# Altium footprint library ST封装.PcbLib: 1336 footprints (part 34 of 109)
Each footprint in its own frame and in the unit in brackets; x right, y up, seen from the top. Pads: shape width x height; smd on the part's side, far side on the other; paste and mask are expansions set on the pad; w line width, h text height; cw(c..) or ccw(c..) is an arc to the next point about the centre after c.
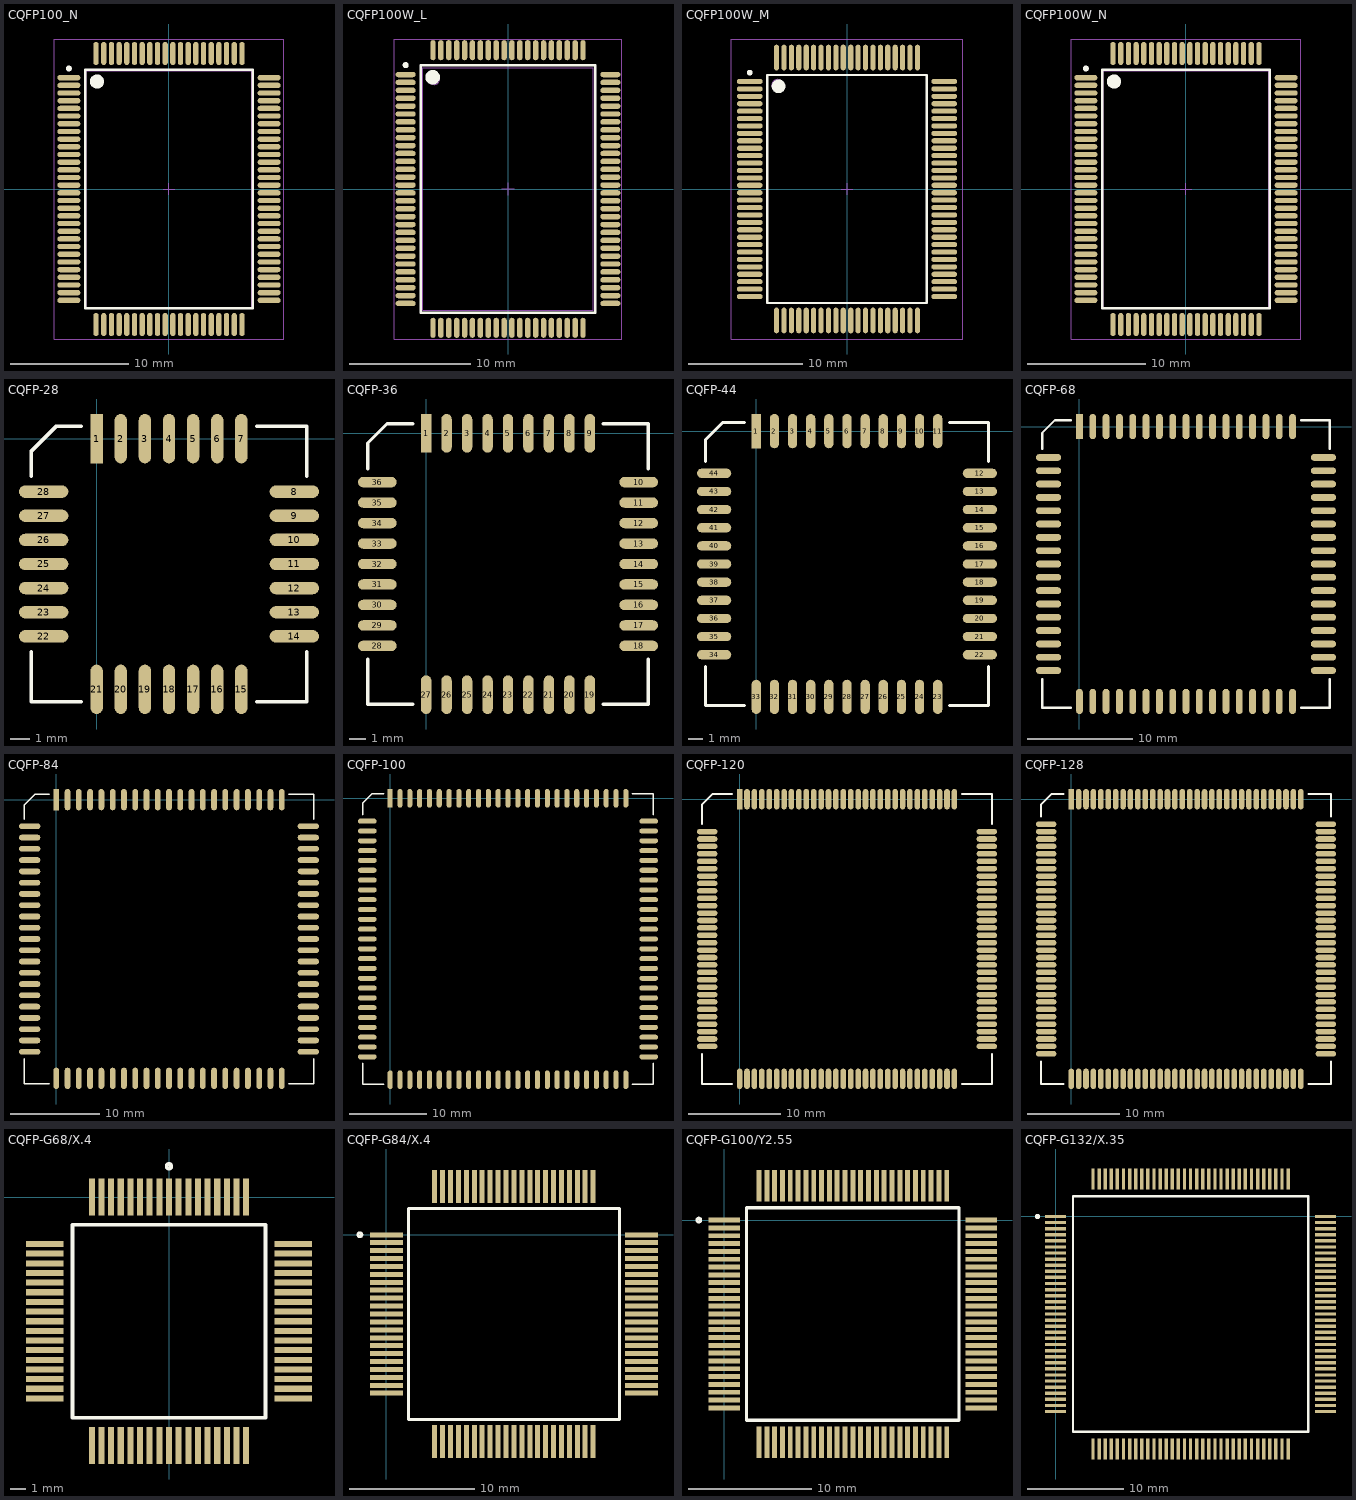
[diagram p33: the footprints below, top view; thin cyan lines are the x and y axes]

## CQFP100_N [mm] "100-Pin Ceramic Quad Flat Pack Rectangular 0.65 mm Pitch, IPC Medium Density"
height 3.4
pads (100):
  oval 1.95x0.45 smd: 1(-8.475,9.425) 2(-8.475,8.775) 3(-8.475,8.125) 4(-8.475,7.475) 5(-8.475,6.825) 6(-8.475,6.175) 7(-8.475,5.525) 8(-8.475,4.875) 9(-8.475,4.225) 10(-8.475,3.575) 11(-8.475,2.925) 12(-8.475,2.275) 13(-8.475,1.625) 14(-8.475,0.975) 15(-8.475,0.325) 16(-8.475,-0.325) 17(-8.475,-0.975) 18(-8.475,-1.625) 19(-8.475,-2.275) 20(-8.475,-2.925) 21(-8.475,-3.575) 22(-8.475,-4.225) 23(-8.475,-4.875) 24(-8.475,-5.525) 25(-8.475,-6.175) 26(-8.475,-6.825) 27(-8.475,-7.475) 28(-8.475,-8.125) 29(-8.475,-8.775) 30(-8.475,-9.425) 51(8.475,-9.425) 52(8.475,-8.775) 53(8.475,-8.125) 54(8.475,-7.475) 55(8.475,-6.825) 56(8.475,-6.175) 57(8.475,-5.525) 58(8.475,-4.875) 59(8.475,-4.225) 60(8.475,-3.575) 61(8.475,-2.925) 62(8.475,-2.275) 63(8.475,-1.625) 64(8.475,-0.975) 65(8.475,-0.325) 66(8.475,0.325) 67(8.475,0.975) 68(8.475,1.625) 69(8.475,2.275) 70(8.475,2.925) 71(8.475,3.575) 72(8.475,4.225) 73(8.475,4.875) 74(8.475,5.525) 75(8.475,6.175) 76(8.475,6.825) 77(8.475,7.475) 78(8.475,8.125) 79(8.475,8.775) 80(8.475,9.425)
  oval 0.45x1.95 smd: 31(-6.175,-11.475) 32(-5.525,-11.475) 33(-4.875,-11.475) 34(-4.225,-11.475) 35(-3.575,-11.475) 36(-2.925,-11.475) 37(-2.275,-11.475) 38(-1.625,-11.475) 39(-0.975,-11.475) 40(-0.325,-11.475) 41(0.325,-11.475) 42(0.975,-11.475) 43(1.625,-11.475) 44(2.275,-11.475) 45(2.925,-11.475) 46(3.575,-11.475) 47(4.225,-11.475) 48(4.875,-11.475) 49(5.525,-11.475) 50(6.175,-11.475) 81(6.175,11.475) 82(5.525,11.475) 83(4.875,11.475) 84(4.225,11.475) 85(3.575,11.475) 86(2.925,11.475) 87(2.275,11.475) 88(1.625,11.475) 89(0.975,11.475) 90(0.325,11.475) 91(-0.325,11.475) 92(-0.975,11.475) 93(-1.625,11.475) 94(-2.275,11.475) 95(-2.925,11.475) 96(-3.575,11.475) 97(-4.225,11.475) 98(-4.875,11.475) 99(-5.525,11.475) 100(-6.175,11.475)
Top Overlay:
  circle w0.25: c-8.475,10.2 r0.125
  circle w0.6: c-6.1,9.1 r0.3
  lines w0.2: -7.1,-10.1 -7.1,10.1 7.1,10.1 7.1,-10.1 -7.1,-10.1
Mechanical 13:
  circle w0.1: c-6.1,9.1 r0.5
  lines w0.1: -7,-10 -7,10 7,10 7,-10 -7,-10
Mechanical 15:
  lines w0.1: -0.5,0 0.5,0 ; 0,-0.5 0,0.5 ; -9.7,-12.7 -9.7,12.7 9.7,12.7 9.7,-12.7 -9.7,-12.7
3D body: height 3.4, standoff 0, extent -7,-10 7,10

## CQFP100W_L [mm] "100-Pin Ceramic Quad Flat Pack Rectangular 0.65 mm Pitch, IPC High Density"
height 3.24
pads (100):
  oval 1.65x0.45 smd: 1(-8.425,9.425) 2(-8.425,8.775) 3(-8.425,8.125) 4(-8.425,7.475) 5(-8.425,6.825) 6(-8.425,6.175) 7(-8.425,5.525) 8(-8.425,4.875) 9(-8.425,4.225) 10(-8.425,3.575) 11(-8.425,2.925) 12(-8.425,2.275) 13(-8.425,1.625) 14(-8.425,0.975) 15(-8.425,0.325) 16(-8.425,-0.325) 17(-8.425,-0.975) 18(-8.425,-1.625) 19(-8.425,-2.275) 20(-8.425,-2.925) 21(-8.425,-3.575) 22(-8.425,-4.225) 23(-8.425,-4.875) 24(-8.425,-5.525) 25(-8.425,-6.175) 26(-8.425,-6.825) 27(-8.425,-7.475) 28(-8.425,-8.125) 29(-8.425,-8.775) 30(-8.425,-9.425) 51(8.425,-9.425) 52(8.425,-8.775) 53(8.425,-8.125) 54(8.425,-7.475) 55(8.425,-6.825) 56(8.425,-6.175) 57(8.425,-5.525) 58(8.425,-4.875) 59(8.425,-4.225) 60(8.425,-3.575) 61(8.425,-2.925) 62(8.425,-2.275) 63(8.425,-1.625) 64(8.425,-0.975) 65(8.425,-0.325) 66(8.425,0.325) 67(8.425,0.975) 68(8.425,1.625) 69(8.425,2.275) 70(8.425,2.925) 71(8.425,3.575) 72(8.425,4.225) 73(8.425,4.875) 74(8.425,5.525) 75(8.425,6.175) 76(8.425,6.825) 77(8.425,7.475) 78(8.425,8.125) 79(8.425,8.775) 80(8.425,9.425)
  oval 0.45x1.65 smd: 31(-6.175,-11.425) 32(-5.525,-11.425) 33(-4.875,-11.425) 34(-4.225,-11.425) 35(-3.575,-11.425) 36(-2.925,-11.425) 37(-2.275,-11.425) 38(-1.625,-11.425) 39(-0.975,-11.425) 40(-0.325,-11.425) 41(0.325,-11.425) 42(0.975,-11.425) 43(1.625,-11.425) 44(2.275,-11.425) 45(2.925,-11.425) 46(3.575,-11.425) 47(4.225,-11.425) 48(4.875,-11.425) 49(5.525,-11.425) 50(6.175,-11.425) 81(6.175,11.425) 82(5.525,11.425) 83(4.875,11.425) 84(4.225,11.425) 85(3.575,11.425) 86(2.925,11.425) 87(2.275,11.425) 88(1.625,11.425) 89(0.975,11.425) 90(0.325,11.425) 91(-0.325,11.425) 92(-0.975,11.425) 93(-1.625,11.425) 94(-2.275,11.425) 95(-2.925,11.425) 96(-3.575,11.425) 97(-4.225,11.425) 98(-4.875,11.425) 99(-5.525,11.425) 100(-6.175,11.425)
Top Overlay:
  circle w0.6: c-6.2,9.2 r0.3
  circle w0.25: c-8.425,10.2 r0.125
  lines w0.2: -7.2,-10.2 7.2,-10.2 7.2,10.2 -7.2,10.2 -7.2,-10.2
Mechanical 13:
  circle w0.1: c-6.1,9.1 r0.5
  lines w0.1: -7,-10 7,-10 7,10 -7,10 -7,-10
Mechanical 15:
  lines w0.1: -0.5,0 0.5,0 ; 0,-0.5 0,0.5 ; -9.35,-12.35 9.35,-12.35 9.35,12.35 -9.35,12.35 -9.35,-12.35
3D body: height 3.24, standoff 0, extent -7,-10 7,10

## CQFP100W_M [mm] "100-Pin Ceramic Quad Flat Pack Rectangular 0.65 mm Pitch, IPC Low Density"
height 3.24
pads (100):
  oval 2.25x0.45 smd: 1(-8.525,9.425) 2(-8.525,8.775) 3(-8.525,8.125) 4(-8.525,7.475) 5(-8.525,6.825) 6(-8.525,6.175) 7(-8.525,5.525) 8(-8.525,4.875) 9(-8.525,4.225) 10(-8.525,3.575) 11(-8.525,2.925) 12(-8.525,2.275) 13(-8.525,1.625) 14(-8.525,0.975) 15(-8.525,0.325) 16(-8.525,-0.325) 17(-8.525,-0.975) 18(-8.525,-1.625) 19(-8.525,-2.275) 20(-8.525,-2.925) 21(-8.525,-3.575) 22(-8.525,-4.225) 23(-8.525,-4.875) 24(-8.525,-5.525) 25(-8.525,-6.175) 26(-8.525,-6.825) 27(-8.525,-7.475) 28(-8.525,-8.125) 29(-8.525,-8.775) 30(-8.525,-9.425) 51(8.525,-9.425) 52(8.525,-8.775) 53(8.525,-8.125) 54(8.525,-7.475) 55(8.525,-6.825) 56(8.525,-6.175) 57(8.525,-5.525) 58(8.525,-4.875) 59(8.525,-4.225) 60(8.525,-3.575) 61(8.525,-2.925) 62(8.525,-2.275) 63(8.525,-1.625) 64(8.525,-0.975) 65(8.525,-0.325) 66(8.525,0.325) 67(8.525,0.975) 68(8.525,1.625) 69(8.525,2.275) 70(8.525,2.925) 71(8.525,3.575) 72(8.525,4.225) 73(8.525,4.875) 74(8.525,5.525) 75(8.525,6.175) 76(8.525,6.825) 77(8.525,7.475) 78(8.525,8.125) 79(8.525,8.775) 80(8.525,9.425)
  oval 0.45x2.25 smd: 31(-6.175,-11.525) 32(-5.525,-11.525) 33(-4.875,-11.525) 34(-4.225,-11.525) 35(-3.575,-11.525) 36(-2.925,-11.525) 37(-2.275,-11.525) 38(-1.625,-11.525) 39(-0.975,-11.525) 40(-0.325,-11.525) 41(0.325,-11.525) 42(0.975,-11.525) 43(1.625,-11.525) 44(2.275,-11.525) 45(2.925,-11.525) 46(3.575,-11.525) 47(4.225,-11.525) 48(4.875,-11.525) 49(5.525,-11.525) 50(6.175,-11.525) 81(6.175,11.525) 82(5.525,11.525) 83(4.875,11.525) 84(4.225,11.525) 85(3.575,11.525) 86(2.925,11.525) 87(2.275,11.525) 88(1.625,11.525) 89(0.975,11.525) 90(0.325,11.525) 91(-0.325,11.525) 92(-0.975,11.525) 93(-1.625,11.525) 94(-2.275,11.525) 95(-2.925,11.525) 96(-3.575,11.525) 97(-4.225,11.525) 98(-4.875,11.525) 99(-5.525,11.525) 100(-6.175,11.525)
Top Overlay:
  circle w0.25: c-8.525,10.2 r0.125
  circle w0.6: c-6,9 r0.3
  lines w0.2: -7,-10 -7,10 7,10 7,-10 -7,-10
Mechanical 13:
  circle w0.1: c-6.1,9.1 r0.5
  lines w0.1: -7,-10 -7,10 7,10 7,-10 -7,-10
Mechanical 15:
  lines w0.1: -0.5,0 0.5,0 ; 0,-0.5 0,0.5 ; -10.15,-13.15 -10.15,13.15 10.15,13.15 10.15,-13.15 -10.15,-13.15
3D body: height 3.24, standoff 0, extent -7,-10 7,10

## CQFP100W_N [mm] "100-Pin Ceramic Quad Flat Pack Rectangular 0.65 mm Pitch, IPC Medium Density"
height 3.24
pads (100):
  oval 1.95x0.45 smd: 1(-8.475,9.425) 2(-8.475,8.775) 3(-8.475,8.125) 4(-8.475,7.475) 5(-8.475,6.825) 6(-8.475,6.175) 7(-8.475,5.525) 8(-8.475,4.875) 9(-8.475,4.225) 10(-8.475,3.575) 11(-8.475,2.925) 12(-8.475,2.275) 13(-8.475,1.625) 14(-8.475,0.975) 15(-8.475,0.325) 16(-8.475,-0.325) 17(-8.475,-0.975) 18(-8.475,-1.625) 19(-8.475,-2.275) 20(-8.475,-2.925) 21(-8.475,-3.575) 22(-8.475,-4.225) 23(-8.475,-4.875) 24(-8.475,-5.525) 25(-8.475,-6.175) 26(-8.475,-6.825) 27(-8.475,-7.475) 28(-8.475,-8.125) 29(-8.475,-8.775) 30(-8.475,-9.425) 51(8.475,-9.425) 52(8.475,-8.775) 53(8.475,-8.125) 54(8.475,-7.475) 55(8.475,-6.825) 56(8.475,-6.175) 57(8.475,-5.525) 58(8.475,-4.875) 59(8.475,-4.225) 60(8.475,-3.575) 61(8.475,-2.925) 62(8.475,-2.275) 63(8.475,-1.625) 64(8.475,-0.975) 65(8.475,-0.325) 66(8.475,0.325) 67(8.475,0.975) 68(8.475,1.625) 69(8.475,2.275) 70(8.475,2.925) 71(8.475,3.575) 72(8.475,4.225) 73(8.475,4.875) 74(8.475,5.525) 75(8.475,6.175) 76(8.475,6.825) 77(8.475,7.475) 78(8.475,8.125) 79(8.475,8.775) 80(8.475,9.425)
  oval 0.45x1.95 smd: 31(-6.175,-11.475) 32(-5.525,-11.475) 33(-4.875,-11.475) 34(-4.225,-11.475) 35(-3.575,-11.475) 36(-2.925,-11.475) 37(-2.275,-11.475) 38(-1.625,-11.475) 39(-0.975,-11.475) 40(-0.325,-11.475) 41(0.325,-11.475) 42(0.975,-11.475) 43(1.625,-11.475) 44(2.275,-11.475) 45(2.925,-11.475) 46(3.575,-11.475) 47(4.225,-11.475) 48(4.875,-11.475) 49(5.525,-11.475) 50(6.175,-11.475) 81(6.175,11.475) 82(5.525,11.475) 83(4.875,11.475) 84(4.225,11.475) 85(3.575,11.475) 86(2.925,11.475) 87(2.275,11.475) 88(1.625,11.475) 89(0.975,11.475) 90(0.325,11.475) 91(-0.325,11.475) 92(-0.975,11.475) 93(-1.625,11.475) 94(-2.275,11.475) 95(-2.925,11.475) 96(-3.575,11.475) 97(-4.225,11.475) 98(-4.875,11.475) 99(-5.525,11.475) 100(-6.175,11.475)
Top Overlay:
  circle w0.25: c-8.475,10.2 r0.125
  circle w0.6: c-6.1,9.1 r0.3
  lines w0.2: -7.1,-10.1 -7.1,10.1 7.1,10.1 7.1,-10.1 -7.1,-10.1
Mechanical 13:
  circle w0.1: c-6.1,9.1 r0.5
  lines w0.1: -7,-10 -7,10 7,10 7,-10 -7,-10
Mechanical 15:
  lines w0.1: -0.5,0 0.5,0 ; 0,-0.5 0,0.5 ; -9.7,-12.7 -9.7,12.7 9.7,12.7 9.7,-12.7 -9.7,-12.7
3D body: height 3.24, standoff 0, extent -7,-10 7,10

## CQFP-28 [mm]
pads (28):
  rect 0.65x2.6 smd: 1(0,0)
  oval 0.65x2.6 smd: 2(1.27,0) 3(2.54,0) 4(3.81,0) 5(5.08,0) 6(6.35,0) 7(7.62,0) 15(7.62,-13.2) 16(6.35,-13.2) 17(5.08,-13.2) 18(3.81,-13.2) 19(2.54,-13.2) 20(1.27,-13.2) 21(0,-13.2)
  oval 2.6x0.65 smd: 8(10.41,-2.79) 9(10.41,-4.06) 10(10.41,-5.33) 11(10.41,-6.6) 12(10.41,-7.87) 13(10.41,-9.14) 14(10.41,-10.41) 22(-2.79,-10.41) 23(-2.79,-9.14) 24(-2.79,-7.87) 25(-2.79,-6.6) 26(-2.79,-5.33) 27(-2.79,-4.06) 28(-2.79,-2.79)
Top Overlay:
  lines w0.2: -3.44,-11.235 -3.44,-13.85 -0.825,-13.85 ; -3.44,-1.965 -3.44,-0.65 -2.14,0.65 -0.825,0.65 ; 8.445,-13.85 11.06,-13.85 11.06,-11.235 ; 8.445,0.65 11.06,0.65 11.06,-1.965

## CQFP-36 [mm]
pads (36):
  rect 0.65x2.4 smd: 1(0,0)
  oval 0.65x2.4 smd: 2(1.27,0) 3(2.54,0) 4(3.81,0) 5(5.08,0) 6(6.35,0) 7(7.62,0) 8(8.89,0) 9(10.16,0) 19(10.16,-16.2) 20(8.89,-16.2) 21(7.62,-16.2) 22(6.35,-16.2) 23(5.08,-16.2) 24(3.81,-16.2) 25(2.54,-16.2) 26(1.27,-16.2) 27(0,-16.2)
  oval 2.4x0.65 smd: 10(13.18,-3.02) 11(13.18,-4.29) 12(13.18,-5.56) 13(13.18,-6.83) 14(13.18,-8.1) 15(13.18,-9.37) 16(13.18,-10.64) 17(13.18,-11.91) 18(13.18,-13.18) 28(-3.02,-13.18) 29(-3.02,-11.91) 30(-3.02,-10.64) 31(-3.02,-9.37) 32(-3.02,-8.1) 33(-3.02,-6.83) 34(-3.02,-5.56) 35(-3.02,-4.29) 36(-3.02,-3.02)
Top Overlay:
  lines w0.2: -3.62,-14.005 -3.62,-16.8 -0.825,-16.8 ; -3.62,-2.195 -3.62,-0.6 -2.42,0.6 -0.825,0.6 ; 10.985,-16.8 13.78,-16.8 13.78,-14.005 ; 10.985,0.6 13.78,0.6 13.78,-2.195

## CQFP-44 [mm]
pads (44):
  rect 0.65x2.4 smd: 1(0,0)
  oval 0.65x2.4 smd: 2(1.27,0) 3(2.54,0) 4(3.81,0) 5(5.08,0) 6(6.35,0) 7(7.62,0) 8(8.89,0) 9(10.16,0) 10(11.43,0) 11(12.7,0) 23(12.7,-18.6) 24(11.43,-18.6) 25(10.16,-18.6) 26(8.89,-18.6) 27(7.62,-18.6) 28(6.35,-18.6) 29(5.08,-18.6) 30(3.81,-18.6) 31(2.54,-18.6) 32(1.27,-18.6) 33(0,-18.6)
  oval 2.4x0.65 smd: 12(15.65,-2.95) 13(15.65,-4.22) 14(15.65,-5.49) 15(15.65,-6.76) 16(15.65,-8.03) 17(15.65,-9.3) 18(15.65,-10.57) 19(15.65,-11.84) 20(15.65,-13.11) 21(15.65,-14.38) 22(15.65,-15.65) 34(-2.95,-15.65) 35(-2.95,-14.38) 36(-2.95,-13.11) 37(-2.95,-11.84) 38(-2.95,-10.57) 39(-2.95,-9.3) 40(-2.95,-8.03) 41(-2.95,-6.76) 42(-2.95,-5.49) 43(-2.95,-4.22) 44(-2.95,-2.95)
Top Overlay:
  lines w0.2: -3.55,-16.475 -3.55,-19.2 -0.825,-19.2 ; -3.55,-2.125 -3.55,-0.6 -2.35,0.6 -0.825,0.6 ; 13.525,-19.2 16.25,-19.2 16.25,-16.475 ; 13.525,0.6 16.25,0.6 16.25,-2.125

## CQFP-68 [mm]
pads (68):
  rect 0.65x2.4 smd: 1(0,0)
  oval 0.65x2.4 smd: 2(1.27,0) 3(2.54,0) 4(3.81,0) 5(5.08,0) 6(6.35,0) 7(7.62,0) 8(8.89,0) 9(10.16,0) 10(11.43,0) 11(12.7,0) 12(13.97,0) 13(15.24,0) 14(16.51,0) 15(17.78,0) 16(19.05,0) 17(20.32,0) 35(20.32,-26.2) 36(19.05,-26.2) 37(17.78,-26.2) 38(16.51,-26.2) 39(15.24,-26.2) 40(13.97,-26.2) 41(12.7,-26.2) 42(11.43,-26.2) 43(10.16,-26.2) 44(8.89,-26.2) 45(7.62,-26.2) 46(6.35,-26.2) 47(5.08,-26.2) 48(3.81,-26.2) 49(2.54,-26.2) 50(1.27,-26.2) 51(0,-26.2)
  oval 2.4x0.65 smd: 18(23.26,-2.94) 19(23.26,-4.21) 20(23.26,-5.48) 21(23.26,-6.75) 22(23.26,-8.02) 23(23.26,-9.29) 24(23.26,-10.56) 25(23.26,-11.83) 26(23.26,-13.1) 27(23.26,-14.37) 28(23.26,-15.64) 29(23.26,-16.91) 30(23.26,-18.18) 31(23.26,-19.45) 32(23.26,-20.72) 33(23.26,-21.99) 34(23.26,-23.26) 52(-2.94,-23.26) 53(-2.94,-21.99) 54(-2.94,-20.72) 55(-2.94,-19.45) 56(-2.94,-18.18) 57(-2.94,-16.91) 58(-2.94,-15.64) 59(-2.94,-14.37) 60(-2.94,-13.1) 61(-2.94,-11.83) 62(-2.94,-10.56) 63(-2.94,-9.29) 64(-2.94,-8.02) 65(-2.94,-6.75) 66(-2.94,-5.48) 67(-2.94,-4.21) 68(-2.94,-2.94)
Top Overlay:
  lines w0.2: -3.54,-24.085 -3.54,-26.8 -0.825,-26.8 ; -3.54,-2.115 -3.54,-0.6 -2.34,0.6 -0.825,0.6 ; 21.145,-26.8 23.86,-26.8 23.86,-24.085 ; 21.145,0.6 23.86,0.6 23.86,-2.115

## CQFP-84 [mm]
pads (84):
  rect 0.65x2.4 smd: 1(0,0)
  oval 0.65x2.4 smd: 2(1.27,0) 3(2.54,0) 4(3.81,0) 5(5.08,0) 6(6.35,0) 7(7.62,0) 8(8.89,0) 9(10.16,0) 10(11.43,0) 11(12.7,0) 12(13.97,0) 13(15.24,0) 14(16.51,0) 15(17.78,0) 16(19.05,0) 17(20.32,0) 18(21.59,0) 19(22.86,0) 20(24.13,0) 21(25.4,0) 43(25.4,-31.4) 44(24.13,-31.4) 45(22.86,-31.4) 46(21.59,-31.4) 47(20.32,-31.4) 48(19.05,-31.4) 49(17.78,-31.4) 50(16.51,-31.4) 51(15.24,-31.4) 52(13.97,-31.4) 53(12.7,-31.4) 54(11.43,-31.4) 55(10.16,-31.4) 56(8.89,-31.4) 57(7.62,-31.4) 58(6.35,-31.4) 59(5.08,-31.4) 60(3.81,-31.4) 61(2.54,-31.4) 62(1.27,-31.4) 63(0,-31.4)
  oval 2.4x0.65 smd: 22(28.4,-3) 23(28.4,-4.27) 24(28.4,-5.54) 25(28.4,-6.81) 26(28.4,-8.08) 27(28.4,-9.35) 28(28.4,-10.62) 29(28.4,-11.89) 30(28.4,-13.16) 31(28.4,-14.43) 32(28.4,-15.7) 33(28.4,-16.97) 34(28.4,-18.24) 35(28.4,-19.51) 36(28.4,-20.78) 37(28.4,-22.05) 38(28.4,-23.32) 39(28.4,-24.59) 40(28.4,-25.86) 41(28.4,-27.13) 42(28.4,-28.4) 64(-3,-28.4) 65(-3,-27.13) 66(-3,-25.86) 67(-3,-24.59) 68(-3,-23.32) 69(-3,-22.05) 70(-3,-20.78) 71(-3,-19.51) 72(-3,-18.24) 73(-3,-16.97) 74(-3,-15.7) 75(-3,-14.43) 76(-3,-13.16) 77(-3,-11.89) 78(-3,-10.62) 79(-3,-9.35) 80(-3,-8.08) 81(-3,-6.81) 82(-3,-5.54) 83(-3,-4.27) 84(-3,-3)
Top Overlay:
  lines w0.2: -3.6,-29.225 -3.6,-32 -0.825,-32 ; -3.6,-2.175 -3.6,-0.6 -2.4,0.6 -0.825,0.6 ; 26.225,-32 29,-32 29,-29.225 ; 26.225,0.6 29,0.6 29,-2.175

## CQFP-100 [mm]
pads (100):
  rect 0.65x2.4 smd: 1(0,0)
  oval 0.65x2.4 smd: 2(1.27,0) 3(2.54,0) 4(3.81,0) 5(5.08,0) 6(6.35,0) 7(7.62,0) 8(8.89,0) 9(10.16,0) 10(11.43,0) 11(12.7,0) 12(13.97,0) 13(15.24,0) 14(16.51,0) 15(17.78,0) 16(19.05,0) 17(20.32,0) 18(21.59,0) 19(22.86,0) 20(24.13,0) 21(25.4,0) 22(26.67,0) 23(27.94,0) 24(29.21,0) 25(30.48,0) 51(30.48,-36.4) 52(29.21,-36.4) 53(27.94,-36.4) 54(26.67,-36.4) 55(25.4,-36.4) 56(24.13,-36.4) 57(22.86,-36.4) 58(21.59,-36.4) 59(20.32,-36.4) 60(19.05,-36.4) 61(17.78,-36.4) 62(16.51,-36.4) 63(15.24,-36.4) 64(13.97,-36.4) 65(12.7,-36.4) 66(11.43,-36.4) 67(10.16,-36.4) 68(8.89,-36.4) 69(7.62,-36.4) 70(6.35,-36.4) 71(5.08,-36.4) 72(3.81,-36.4) 73(2.54,-36.4) 74(1.27,-36.4) 75(0,-36.4)
  oval 2.4x0.65 smd: 26(33.44,-2.96) 27(33.44,-4.23) 28(33.44,-5.5) 29(33.44,-6.77) 30(33.44,-8.04) 31(33.44,-9.31) 32(33.44,-10.58) 33(33.44,-11.85) 34(33.44,-13.12) 35(33.44,-14.39) 36(33.44,-15.66) 37(33.44,-16.93) 38(33.44,-18.2) 39(33.44,-19.47) 40(33.44,-20.74) 41(33.44,-22.01) 42(33.44,-23.28) 43(33.44,-24.55) 44(33.44,-25.82) 45(33.44,-27.09) 46(33.44,-28.36) 47(33.44,-29.63) 48(33.44,-30.9) 49(33.44,-32.17) 50(33.44,-33.44) 76(-2.96,-33.44) 77(-2.96,-32.17) 78(-2.96,-30.9) 79(-2.96,-29.63) 80(-2.96,-28.36) 81(-2.96,-27.09) 82(-2.96,-25.82) 83(-2.96,-24.55) 84(-2.96,-23.28) 85(-2.96,-22.01) 86(-2.96,-20.74) 87(-2.96,-19.47) 88(-2.96,-18.2) 89(-2.96,-16.93) 90(-2.96,-15.66) 91(-2.96,-14.39) 92(-2.96,-13.12) 93(-2.96,-11.85) 94(-2.96,-10.58) 95(-2.96,-9.31) 96(-2.96,-8.04) 97(-2.96,-6.77) 98(-2.96,-5.5) 99(-2.96,-4.23) 100(-2.96,-2.96)
Top Overlay:
  lines w0.2: -3.56,-34.265 -3.56,-37 -0.825,-37 ; -3.56,-2.135 -3.56,-0.6 -2.36,0.6 -0.825,0.6 ; 31.305,-37 34.04,-37 34.04,-34.265 ; 31.305,0.6 34.04,0.6 34.04,-2.135

## CQFP-120 [mm]
pads (120):
  rect 0.6x2.2 smd: 1(0,0)
  oval 0.6x2.2 smd: 2(0.8,0) 3(1.6,0) 4(2.4,0) 5(3.2,0) 6(4,0) 7(4.8,0) 8(5.6,0) 9(6.4,0) 10(7.2,0) 11(8,0) 12(8.8,0) 13(9.6,0) 14(10.4,0) 15(11.2,0) 16(12,0) 17(12.8,0) 18(13.6,0) 19(14.4,0) 20(15.2,0) 21(16,0) 22(16.8,0) 23(17.6,0) 24(18.4,0) 25(19.2,0) 26(20,0) 27(20.8,0) 28(21.6,0) 29(22.4,0) 30(23.2,0) 61(23.2,-30.2) 62(22.4,-30.2) 63(21.6,-30.2) 64(20.8,-30.2) 65(20,-30.2) 66(19.2,-30.2) 67(18.4,-30.2) 68(17.6,-30.2) 69(16.8,-30.2) 70(16,-30.2) 71(15.2,-30.2) 72(14.4,-30.2) 73(13.6,-30.2) 74(12.8,-30.2) 75(12,-30.2) 76(11.2,-30.2) 77(10.4,-30.2) 78(9.6,-30.2) 79(8.8,-30.2) 80(8,-30.2) 81(7.2,-30.2) 82(6.4,-30.2) 83(5.6,-30.2) 84(4.8,-30.2) 85(4,-30.2) 86(3.2,-30.2) 87(2.4,-30.2) 88(1.6,-30.2) 89(0.8,-30.2) 90(0,-30.2)
  oval 2.2x0.6 smd: 31(26.7,-3.5) 32(26.7,-4.3) 33(26.7,-5.1) 34(26.7,-5.9) 35(26.7,-6.7) 36(26.7,-7.5) 37(26.7,-8.3) 38(26.7,-9.1) 39(26.7,-9.9) 40(26.7,-10.7) 41(26.7,-11.5) 42(26.7,-12.3) 43(26.7,-13.1) 44(26.7,-13.9) 45(26.7,-14.7) 46(26.7,-15.5) 47(26.7,-16.3) 48(26.7,-17.1) 49(26.7,-17.9) 50(26.7,-18.7) 51(26.7,-19.5) 52(26.7,-20.3) 53(26.7,-21.1) 54(26.7,-21.9) 55(26.7,-22.7) 56(26.7,-23.5) 57(26.7,-24.3) 58(26.7,-25.1) 59(26.7,-25.9) 60(26.7,-26.7) 91(-3.5,-26.7) 92(-3.5,-25.9) 93(-3.5,-25.1) 94(-3.5,-24.3) 95(-3.5,-23.5) 96(-3.5,-22.7) 97(-3.5,-21.9) 98(-3.5,-21.1) 99(-3.5,-20.3) 100(-3.5,-19.5) 101(-3.5,-18.7) 102(-3.5,-17.9) 103(-3.5,-17.1) 104(-3.5,-16.3) 105(-3.5,-15.5) 106(-3.5,-14.7) 107(-3.5,-13.9) 108(-3.5,-13.1) 109(-3.5,-12.3) 110(-3.5,-11.5) 111(-3.5,-10.7) 112(-3.5,-9.9) 113(-3.5,-9.1) 114(-3.5,-8.3) 115(-3.5,-7.5) 116(-3.5,-6.7) 117(-3.5,-5.9) 118(-3.5,-5.1) 119(-3.5,-4.3) 120(-3.5,-3.5)
Top Overlay:
  lines w0.2: -4.05,-27.5 -4.05,-30.75 -0.8,-30.75 ; -4.05,-2.7 -4.05,-0.55 -2.95,0.55 -0.8,0.55 ; 24,-30.75 27.25,-30.75 27.25,-27.5 ; 24,0.55 27.25,0.55 27.25,-2.7

## CQFP-128 [mm]
pads (128):
  rect 0.6x2.2 smd: 1(0,0)
  oval 0.6x2.2 smd: 2(0.8,0) 3(1.6,0) 4(2.4,0) 5(3.2,0) 6(4,0) 7(4.8,0) 8(5.6,0) 9(6.4,0) 10(7.2,0) 11(8,0) 12(8.8,0) 13(9.6,0) 14(10.4,0) 15(11.2,0) 16(12,0) 17(12.8,0) 18(13.6,0) 19(14.4,0) 20(15.2,0) 21(16,0) 22(16.8,0) 23(17.6,0) 24(18.4,0) 25(19.2,0) 26(20,0) 27(20.8,0) 28(21.6,0) 29(22.4,0) 30(23.2,0) 31(24,0) 32(24.8,0) 65(24.8,-30.2) 66(24,-30.2) 67(23.2,-30.2) 68(22.4,-30.2) 69(21.6,-30.2) 70(20.8,-30.2) 71(20,-30.2) 72(19.2,-30.2) 73(18.4,-30.2) 74(17.6,-30.2) 75(16.8,-30.2) 76(16,-30.2) 77(15.2,-30.2) 78(14.4,-30.2) 79(13.6,-30.2) 80(12.8,-30.2) 81(12,-30.2) 82(11.2,-30.2) 83(10.4,-30.2) 84(9.6,-30.2) 85(8.8,-30.2) 86(8,-30.2) 87(7.2,-30.2) 88(6.4,-30.2) 89(5.6,-30.2) 90(4.8,-30.2) 91(4,-30.2) 92(3.2,-30.2) 93(2.4,-30.2) 94(1.6,-30.2) 95(0.8,-30.2) 96(0,-30.2)
  oval 2.2x0.6 smd: 33(27.5,-2.7) 34(27.5,-3.5) 35(27.5,-4.3) 36(27.5,-5.1) 37(27.5,-5.9) 38(27.5,-6.7) 39(27.5,-7.5) 40(27.5,-8.3) 41(27.5,-9.1) 42(27.5,-9.9) 43(27.5,-10.7) 44(27.5,-11.5) 45(27.5,-12.3) 46(27.5,-13.1) 47(27.5,-13.9) 48(27.5,-14.7) 49(27.5,-15.5) 50(27.5,-16.3) 51(27.5,-17.1) 52(27.5,-17.9) 53(27.5,-18.7) 54(27.5,-19.5) 55(27.5,-20.3) 56(27.5,-21.1) 57(27.5,-21.9) 58(27.5,-22.7) 59(27.5,-23.5) 60(27.5,-24.3) 61(27.5,-25.1) 62(27.5,-25.9) 63(27.5,-26.7) 64(27.5,-27.5) 97(-2.7,-27.5) 98(-2.7,-26.7) 99(-2.7,-25.9) 100(-2.7,-25.1) 101(-2.7,-24.3) 102(-2.7,-23.5) 103(-2.7,-22.7) 104(-2.7,-21.9) 105(-2.7,-21.1) 106(-2.7,-20.3) 107(-2.7,-19.5) 108(-2.7,-18.7) 109(-2.7,-17.9) 110(-2.7,-17.1) 111(-2.7,-16.3) 112(-2.7,-15.5) 113(-2.7,-14.7) 114(-2.7,-13.9) 115(-2.7,-13.1) 116(-2.7,-12.3) 117(-2.7,-11.5) 118(-2.7,-10.7) 119(-2.7,-9.9) 120(-2.7,-9.1) 121(-2.7,-8.3) 122(-2.7,-7.5) 123(-2.7,-6.7) 124(-2.7,-5.9) 125(-2.7,-5.1) 126(-2.7,-4.3) 127(-2.7,-3.5) 128(-2.7,-2.7)
Top Overlay:
  lines w0.2: -3.25,-28.3 -3.25,-30.75 -0.8,-30.75 ; -3.25,-1.9 -3.25,-0.55 -2.15,0.55 -0.8,0.55 ; 25.6,-30.75 28.05,-30.75 28.05,-28.3 ; 25.6,0.55 28.05,0.55 28.05,-1.9

## CQFP-G68/X.4 [mm]
pads (68):
  rect 0.4x2.45 smd: 1(0,0) 2(-0.635,0) 3(-1.27,0) 4(-1.905,0) 5(-2.54,0) 6(-3.175,0) 7(-3.81,0) 8(-4.445,0) 9(-5.08,0) 27(-5.08,-16.35) 28(-4.445,-16.35) 29(-3.81,-16.35) 30(-3.175,-16.35) 31(-2.54,-16.35) 32(-1.905,-16.35) 33(-1.27,-16.35) 34(-0.635,-16.35) 35(0,-16.35) 36(0.635,-16.35) 37(1.27,-16.35) 38(1.905,-16.35) 39(2.54,-16.35) 40(3.175,-16.35) 41(3.81,-16.35) 42(4.445,-16.35) 43(5.08,-16.35) 61(5.08,0) 62(4.445,0) 63(3.81,0) 64(3.175,0) 65(2.54,0) 66(1.905,0) 67(1.27,0) 68(0.635,0)
  rect 2.45x0.4 smd: 10(-8.175,-3.095) 11(-8.175,-3.73) 12(-8.175,-4.365) 13(-8.175,-5) 14(-8.175,-5.635) 15(-8.175,-6.27) 16(-8.175,-6.905) 17(-8.175,-7.54) 18(-8.175,-8.175) 19(-8.175,-8.81) 20(-8.175,-9.445) 21(-8.175,-10.08) 22(-8.175,-10.715) 23(-8.175,-11.35) 24(-8.175,-11.985) 25(-8.175,-12.62) 26(-8.175,-13.255) 44(8.175,-13.255) 45(8.175,-12.62) 46(8.175,-11.985) 47(8.175,-11.35) 48(8.175,-10.715) 49(8.175,-10.08) 50(8.175,-9.445) 51(8.175,-8.81) 52(8.175,-8.175) 53(8.175,-7.54) 54(8.175,-6.905) 55(8.175,-6.27) 56(8.175,-5.635) 57(8.175,-5) 58(8.175,-4.365) 59(8.175,-3.73) 60(8.175,-3.095)
Top Overlay:
  circle w0.25: c0,2.025 r0.15
  lines w0.25: -6.35,-14.525 6.35,-14.525 6.35,-1.825 -6.35,-1.825 -6.35,-14.525

## CQFP-G84/X.4 [mm]
pads (84):
  rect 2.65x0.4 smd: 1(0,0) 2(0,-0.635) 3(0,-1.27) 4(0,-1.905) 5(0,-2.54) 6(0,-3.175) 7(0,-3.81) 8(0,-4.445) 9(0,-5.08) 10(0,-5.715) 11(0,-6.35) 12(0,-6.985) 13(0,-7.62) 14(0,-8.255) 15(0,-8.89) 16(0,-9.525) 17(0,-10.16) 18(0,-10.795) 19(0,-11.43) 20(0,-12.065) 21(0,-12.7) 43(20.45,-12.7) 44(20.45,-12.065) 45(20.45,-11.43) 46(20.45,-10.795) 47(20.45,-10.16) 48(20.45,-9.525) 49(20.45,-8.89) 50(20.45,-8.255) 51(20.45,-7.62) 52(20.45,-6.985) 53(20.45,-6.35) 54(20.45,-5.715) 55(20.45,-5.08) 56(20.45,-4.445) 57(20.45,-3.81) 58(20.45,-3.175) 59(20.45,-2.54) 60(20.45,-1.905) 61(20.45,-1.27) 62(20.45,-0.635) 63(20.45,0)
  rect 0.4x2.65 smd: 22(3.875,-16.575) 23(4.51,-16.575) 24(5.145,-16.575) 25(5.78,-16.575) 26(6.415,-16.575) 27(7.05,-16.575) 28(7.685,-16.575) 29(8.32,-16.575) 30(8.955,-16.575) 31(9.59,-16.575) 32(10.225,-16.575) 33(10.86,-16.575) 34(11.495,-16.575) 35(12.13,-16.575) 36(12.765,-16.575) 37(13.4,-16.575) 38(14.035,-16.575) 39(14.67,-16.575) 40(15.305,-16.575) 41(15.94,-16.575) 42(16.575,-16.575) 64(16.575,3.875) 65(15.94,3.875) 66(15.305,3.875) 67(14.67,3.875) 68(14.035,3.875) 69(13.4,3.875) 70(12.765,3.875) 71(12.13,3.875) 72(11.495,3.875) 73(10.86,3.875) 74(10.225,3.875) 75(9.59,3.875) 76(8.955,3.875) 77(8.32,3.875) 78(7.685,3.875) 79(7.05,3.875) 80(6.415,3.875) 81(5.78,3.875) 82(5.145,3.875) 83(4.51,3.875) 84(3.875,3.875)
Top Overlay:
  circle w0.25: c-2.125,0 r0.15
  lines w0.25: 1.775,-14.8 18.675,-14.8 18.675,2.1 1.775,2.1 1.775,-14.8

## CQFP-G100/Y2.55 [mm]
pads (100):
  rect 2.55x0.4 smd: 1(0,0) 2(0,-0.635) 3(0,-1.27) 4(0,-1.905) 5(0,-2.54) 6(0,-3.175) 7(0,-3.81) 8(0,-4.445) 9(0,-5.08) 10(0,-5.715) 11(0,-6.35) 12(0,-6.985) 13(0,-7.62) 14(0,-8.255) 15(0,-8.89) 16(0,-9.525) 17(0,-10.16) 18(0,-10.795) 19(0,-11.43) 20(0,-12.065) 21(0,-12.7) 22(0,-13.335) 23(0,-13.97) 24(0,-14.605) 25(0,-15.24) 51(20.85,-15.24) 52(20.85,-14.605) 53(20.85,-13.97) 54(20.85,-13.335) 55(20.85,-12.7) 56(20.85,-12.065) 57(20.85,-11.43) 58(20.85,-10.795) 59(20.85,-10.16) 60(20.85,-9.525) 61(20.85,-8.89) 62(20.85,-8.255) 63(20.85,-7.62) 64(20.85,-6.985) 65(20.85,-6.35) 66(20.85,-5.715) 67(20.85,-5.08) 68(20.85,-4.445) 69(20.85,-3.81) 70(20.85,-3.175) 71(20.85,-2.54) 72(20.85,-1.905) 73(20.85,-1.27) 74(20.85,-0.635) 75(20.85,0)
  rect 0.4x2.55 smd: 26(2.805,-18.045) 27(3.44,-18.045) 28(4.075,-18.045) 29(4.71,-18.045) 30(5.345,-18.045) 31(5.98,-18.045) 32(6.615,-18.045) 33(7.25,-18.045) 34(7.885,-18.045) 35(8.52,-18.045) 36(9.155,-18.045) 37(9.79,-18.045) 38(10.425,-18.045) 39(11.06,-18.045) 40(11.695,-18.045) 41(12.33,-18.045) 42(12.965,-18.045) 43(13.6,-18.045) 44(14.235,-18.045) 45(14.87,-18.045) 46(15.505,-18.045) 47(16.14,-18.045) 48(16.775,-18.045) 49(17.41,-18.045) 50(18.045,-18.045) 76(18.045,2.805) 77(17.41,2.805) 78(16.775,2.805) 79(16.14,2.805) 80(15.505,2.805) 81(14.87,2.805) 82(14.235,2.805) 83(13.6,2.805) 84(12.965,2.805) 85(12.33,2.805) 86(11.695,2.805) 87(11.06,2.805) 88(10.425,2.805) 89(9.79,2.805) 90(9.155,2.805) 91(8.52,2.805) 92(7.885,2.805) 93(7.25,2.805) 94(6.615,2.805) 95(5.98,2.805) 96(5.345,2.805) 97(4.71,2.805) 98(4.075,2.805) 99(3.44,2.805) 100(2.805,2.805)
Top Overlay:
  circle w0.25: c-2.075,0 r0.15
  lines w0.25: 1.8,-16.245 1.8,1.005 19.05,1.005 19.05,-16.245 1.8,-16.245

## CQFP-G132/X.35 [mm]
pads (132):
  rect 2.2x0.35 smd: 1(0,0) 2(0,-0.635) 3(0,-1.27) 4(0,-1.905) 5(0,-2.54) 6(0,-3.175) 7(0,-3.81) 8(0,-4.445) 9(0,-5.08) 10(0,-5.715) 11(0,-6.35) 12(0,-6.985) 13(0,-7.62) 14(0,-8.255) 15(0,-8.89) 16(0,-9.525) 17(0,-10.16) 18(0,-10.795) 19(0,-11.43) 20(0,-12.065) 21(0,-12.7) 22(0,-13.335) 23(0,-13.97) 24(0,-14.605) 25(0,-15.24) 26(0,-15.875) 27(0,-16.51) 28(0,-17.145) 29(0,-17.78) 30(0,-18.415) 31(0,-19.05) 32(0,-19.685) 33(0,-20.32) 67(28.1,-20.32) 68(28.1,-19.685) 69(28.1,-19.05) 70(28.1,-18.415) 71(28.1,-17.78) 72(28.1,-17.145) 73(28.1,-16.51) 74(28.1,-15.875) 75(28.1,-15.24) 76(28.1,-14.605) 77(28.1,-13.97) 78(28.1,-13.335) 79(28.1,-12.7) 80(28.1,-12.065) 81(28.1,-11.43) 82(28.1,-10.795) 83(28.1,-10.16) 84(28.1,-9.525) 85(28.1,-8.89) 86(28.1,-8.255) 87(28.1,-7.62) 88(28.1,-6.985) 89(28.1,-6.35) 90(28.1,-5.715) 91(28.1,-5.08) 92(28.1,-4.445) 93(28.1,-3.81) 94(28.1,-3.175) 95(28.1,-2.54) 96(28.1,-1.905) 97(28.1,-1.27) 98(28.1,-0.635) 99(28.1,0)
  rect 0.35x2.2 smd: 34(3.89,-24.21) 35(4.525,-24.21) 36(5.16,-24.21) 37(5.795,-24.21) 38(6.43,-24.21) 39(7.065,-24.21) 40(7.7,-24.21) 41(8.335,-24.21) 42(8.97,-24.21) 43(9.605,-24.21) 44(10.24,-24.21) 45(10.875,-24.21) 46(11.51,-24.21) 47(12.145,-24.21) 48(12.78,-24.21) 49(13.415,-24.21) 50(14.05,-24.21) 51(14.685,-24.21) 52(15.32,-24.21) 53(15.955,-24.21) 54(16.59,-24.21) 55(17.225,-24.21) 56(17.86,-24.21) 57(18.495,-24.21) 58(19.13,-24.21) 59(19.765,-24.21) 60(20.4,-24.21) 61(21.035,-24.21) 62(21.67,-24.21) 63(22.305,-24.21) 64(22.94,-24.21) 65(23.575,-24.21) 66(24.21,-24.21) 100(24.21,3.89) 101(23.575,3.89) 102(22.94,3.89) 103(22.305,3.89) 104(21.67,3.89) 105(21.035,3.89) 106(20.4,3.89) 107(19.765,3.89) 108(19.13,3.89) 109(18.495,3.89) 110(17.86,3.89) 111(17.225,3.89) 112(16.59,3.89) 113(15.955,3.89) 114(15.32,3.89) 115(14.685,3.89) 116(14.05,3.89) 117(13.415,3.89) 118(12.78,3.89) 119(12.145,3.89) 120(11.51,3.89) 121(10.875,3.89) 122(10.24,3.89) 123(9.605,3.89) 124(8.97,3.89) 125(8.335,3.89) 126(7.7,3.89) 127(7.065,3.89) 128(6.43,3.89) 129(5.795,3.89) 130(5.16,3.89) 131(4.525,3.89) 132(3.89,3.89)
Top Overlay:
  circle w0.25: c-1.9,0 r0.15
  lines w0.25: 1.8,-22.41 1.8,2.09 26.3,2.09 26.3,-22.41 1.8,-22.41